# Altium footprint library PcbLib.PcbLib: 428 footprints (part 24 of 27)
Each footprint in its own frame and in the unit in brackets; x right, y up, seen from the top. Pads: shape width x height; smd on the part's side, far side on the other; paste and mask are expansions set on the pad; w line width, h text height; cw(c..) or ccw(c..) is an arc to the next point about the centre after c.
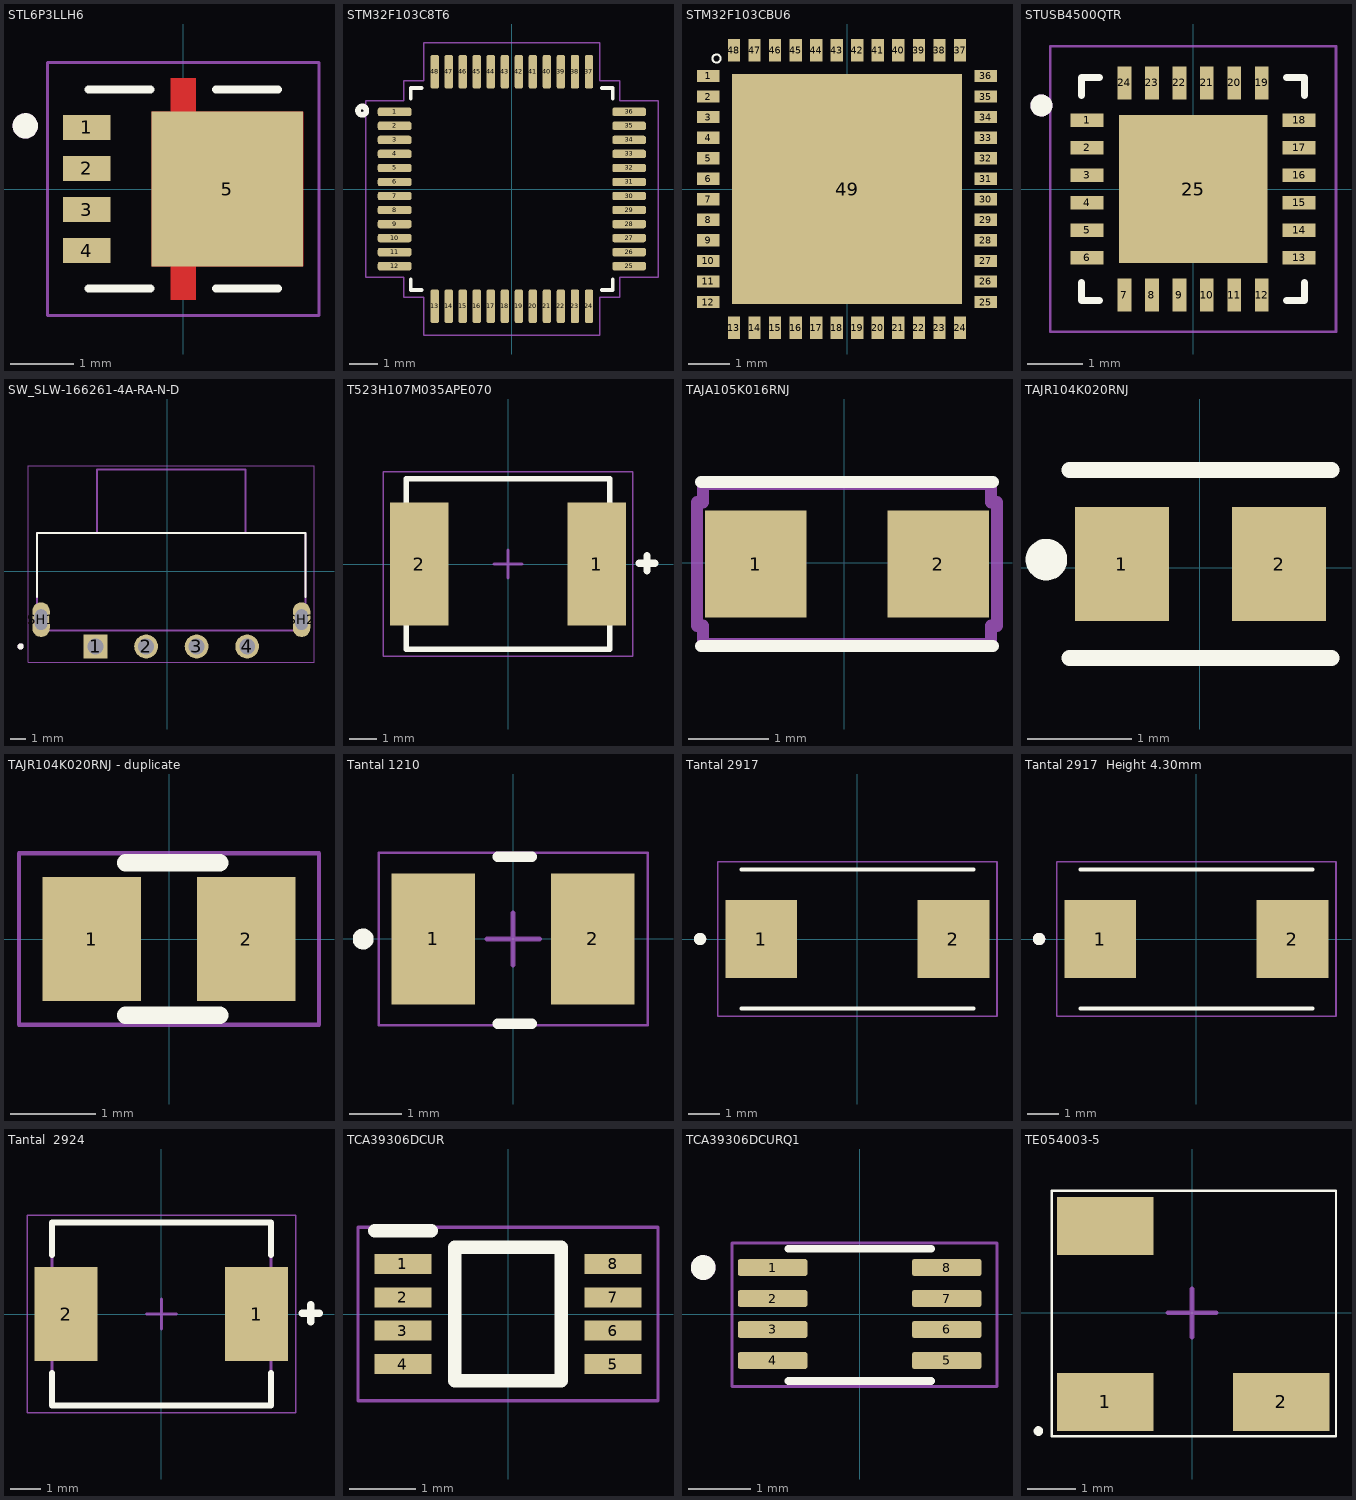
[diagram p23: the footprints below, top view; thin cyan lines are the x and y axes]

## STL6P3LLH6 [mm]
pads (5):
  rect 0.75x0.4 smd: 1(-1.525,0.975) 2(-1.525,0.325) 3(-1.525,-0.325) 4(-1.525,-0.975)
  rect 2.4x2.45 smd paste-0.44 mask+0.1: 5(0.7,0)
Top Layer:
  region: 0.2,1.225 1.9,1.225 1.9,-1.225 0.2,-1.225 0.2,-1.755 -0.2,-1.755 -0.2,-1.225 -0.5,-1.225 -0.5,1.225 -0.2,1.225 -0.2,1.755 0.2,1.755
Top Overlay:
  circle w0.2: c-2.5,1 r0.1
  lines w0.127: -1.5,-1.575 -0.52,-1.575 ; -1.5,1.575 -0.52,1.575 ; 0.52,-1.575 1.5,-1.575 ; 0.52,1.575 1.5,1.575
Top Paste:
  region: 0.2,1.23 -0.2,1.23 -0.2,1.755 0.2,1.755
  region: 0.2,-1.755 -0.2,-1.755 -0.2,-1.23 0.2,-1.23
Top Solder:
  rectangle: -0.291,-1.824 0.283,-1.3
  rectangle: -0.286,1.316 0.288,1.841
Mechanical 13:
  circle w0.2: c-2.5,1 r0.1
Mechanical 15:
  lines w0.05: -2.15,-2.005 2.15,-2.005 2.15,2.005 -2.15,2.005 -2.15,-2.005
3D body "step_temp.STEP": height 0.9, standoff 0, extent -1.65,-1.65 1.65,1.65

## STM32F103C8T6 [mm]
pads (48):
  rrect50% 1.2x0.3 smd: 1(-4.18,2.75) 2(-4.18,2.25) 3(-4.18,1.75) 4(-4.18,1.25) 5(-4.18,0.75) 6(-4.18,0.25) 7(-4.18,-0.25) 8(-4.18,-0.75) 9(-4.18,-1.25) 10(-4.18,-1.75) 11(-4.18,-2.25) 12(-4.18,-2.75) 25(4.18,-2.75) 26(4.18,-2.25) 27(4.18,-1.75) 28(4.18,-1.25) 29(4.18,-0.75) 30(4.18,-0.25) 31(4.18,0.25) 32(4.18,0.75) 33(4.18,1.25) 34(4.18,1.75) 35(4.18,2.25) 36(4.18,2.75)
  rrect50% 0.3x1.2 smd: 13(-2.75,-4.18) 14(-2.25,-4.18) 15(-1.75,-4.18) 16(-1.25,-4.18) 17(-0.75,-4.18) 18(-0.25,-4.18) 19(0.25,-4.18) 20(0.75,-4.18) 21(1.25,-4.18) 22(1.75,-4.18) 23(2.25,-4.18) 24(2.75,-4.18) 37(2.75,4.18) 38(2.25,4.18) 39(1.75,4.18) 40(1.25,4.18) 41(0.75,4.18) 42(0.25,4.18) 43(-0.25,4.18) 44(-0.75,4.18) 45(-1.25,4.18) 46(-1.75,4.18) 47(-2.25,4.18) 48(-2.75,4.18)
Top Overlay:
  circle w0.2: c-5.334,2.794 r0.15
  lines w0.127: -3.6,-3.21 -3.6,-3.6 -3.21,-3.6 ; -3.6,3.21 -3.6,3.6 -3.21,3.6 ; 3.21,-3.6 3.6,-3.6 3.6,-3.21 ; 3.21,3.6 3.6,3.6 3.6,3.21
Mechanical 15:
  lines w0.05: -5.21,-3.14 -5.21,3.14 -3.85,3.14 -3.85,3.85 -3.14,3.85 -3.14,5.21 3.14,5.21 3.14,3.85 3.85,3.85 3.85,3.14 5.21,3.14 5.21,-3.14 3.85,-3.14 3.85,-3.85 3.14,-3.85 3.14,-5.21 -3.14,-5.21 -3.14,-3.85 -3.85,-3.85 -3.85,-3.14 -5.21,-3.14
3D body "step_temp.STEP": height 1.6, standoff 0, extent -4.5,-4.5 4.5,4.5

## STM32F103CBU6 [mm]
pads (49):
  rect 0.55x0.3 smd: 1(-3.375,2.75) 2(-3.375,2.25) 3(-3.375,1.75) 4(-3.375,1.25) 5(-3.375,0.75) 6(-3.375,0.25) 7(-3.375,-0.25) 8(-3.375,-0.75) 9(-3.375,-1.25) 10(-3.375,-1.75) 11(-3.375,-2.25) 12(-3.375,-2.75) 25(3.375,-2.75) 26(3.375,-2.25) 27(3.375,-1.75) 28(3.375,-1.25) 29(3.375,-0.75) 30(3.375,-0.25) 31(3.375,0.25) 32(3.375,0.75) 33(3.375,1.25) 34(3.375,1.75) 35(3.375,2.25) 36(3.375,2.75)
  rect 0.3x0.55 smd: 13(-2.75,-3.375) 14(-2.25,-3.375) 15(-1.75,-3.375) 16(-1.25,-3.375) 17(-0.75,-3.375) 18(-0.25,-3.375) 19(0.25,-3.375) 20(0.75,-3.375) 21(1.25,-3.375) 22(1.75,-3.375) 23(2.25,-3.375) 24(2.75,-3.375) 37(2.75,3.375) 38(2.25,3.375) 39(1.75,3.375) 40(1.25,3.375) 41(0.75,3.375) 42(0.25,3.375) 43(-0.25,3.375) 44(-0.75,3.375) 45(-1.25,3.375) 46(-1.75,3.375) 47(-2.25,3.375) 48(-2.75,3.375)
  rect 5.6x5.6 smd paste-0.7: 49(0,0)
Top Overlay:
  circle w0.05: c-3.175,3.175 r0.1
3D body "step_temp.STEP": height 0.6, standoff 0, extent -3.5,-3.5 3.5,3.5

## STUSB4500QTR [mm]
pads (25):
  rect 0.6x0.25 smd: 1(-1.93,1.25) 2(-1.93,0.75) 3(-1.93,0.25) 4(-1.93,-0.25) 5(-1.93,-0.75) 6(-1.93,-1.25) 13(1.93,-1.25) 14(1.93,-0.75) 15(1.93,-0.25) 16(1.93,0.25) 17(1.93,0.75) 18(1.93,1.25)
  rect 0.25x0.6 smd: 7(-1.25,-1.93) 8(-0.75,-1.93) 9(-0.25,-1.93) 10(0.25,-1.93) 11(0.75,-1.93) 12(1.25,-1.93) 19(1.25,1.93) 20(0.75,1.93) 21(0.25,1.93) 22(-0.25,1.93) 23(-0.75,1.93) 24(-1.25,1.93)
  rect 2.7x2.7 smd paste-2: 25(0,0)
Top Overlay:
  circle w0.2: c-2.76,1.52 r0.1
  lines w0.127: -2.03,-1.7 -2.03,-2.03 -1.7,-2.03 ; -2.03,1.7 -2.03,2.03 -1.7,2.03 ; 1.7,-2.03 2.03,-2.03 2.03,-1.7 ; 1.7,2.03 2.03,2.03 2.03,1.7
Top Paste:
  region: 1.09,0.13 0.13,0.13 0.13,1.09 1.09,1.09
  region: -0.13,0.13 -1.09,0.13 -1.09,1.09 -0.13,1.09
  region: -0.13,-1.09 -1.09,-1.09 -1.09,-0.13 -0.13,-0.13
  region: 1.09,-1.09 0.13,-1.09 0.13,-0.13 1.09,-0.13
Mechanical 13:
  circle w0.2: c-2.76,1.52 r0.1
Mechanical 15:
  lines w0.05: -2.6,-2.6 2.6,-2.6 2.6,2.6 -2.6,2.6 -2.6,-2.6
3D body "step_temp.STEP": height 1, standoff 0, extent -2,-2 2,2

## SW_SLW-166261-4A-RA-N-D [mm]
pads (6):
  rect 1.508x1.508 / inner round 1.508 / far side rect 1.508x1.508 hole 1 mask+0.102: 1(-4.546,-4.75)
  round 1.508 hole 1 mask+0.102: 2(-1.346,-4.75) 3(1.854,-4.75) 4(5.054,-4.75)
  oval 1.1x2.2 hole 0.8 slot 1.3 at 90 deg mask+0.102: SH1(-7.996,-3.05) SH2(8.504,-3.05)
Top Overlay:
  circle w0.2: c-9.296,-4.75 r0.1
  lines w0.127: -8.246,-1.63 -8.246,2.45 8.754,2.45 8.754,-1.63
Mechanical 13:
  circle w0.2: c-9.296,-4.75 r0.1
  lines w0.127: -4.446,2.45 4.954,2.45 ; -4.446,2.45 -8.246,2.45 -8.246,-3.75 8.754,-3.75 8.754,2.45 4.954,2.45 ; -4.446,2.45 -4.446,6.45 4.954,6.45 4.954,2.45
Mechanical 15:
  lines w0.05: -8.796,-5.754 -8.796,6.7 9.304,6.7 9.304,-5.754 -8.796,-5.754
3D body "step_temp.STEP": height 6.16, standoff -4.39, extent -8.246,-4.947 8.754,6.553

## T523H107M035APE070 [mm] "Molded Capacitor, 2-Leads, Body 7.30x6.10mm, IPC Medium Density"
height 4.1
pads (2):
  rect 2.1x4.4 smd: 1(3.175,0) 2(-3.175,0)
Top Overlay:
  lines w0.2: -3.65,-1.975 -3.65,-3.05 3.65,-3.05 3.65,-1.975 ; -3.65,1.975 -3.65,3.05 3.65,3.05 3.65,1.975
  lines w0.254: 4.699,0.025 5.258,0.025 ; 4.978,-0.254 4.978,0.305
Mechanical 15:
  lines w0.05: -4.475,-3.3 -4.475,3.3 4.475,3.3 4.475,-3.3 -4.475,-3.3
  lines w0.1: -0.5,0 0.5,0 ; 0,-0.5 0,0.5
3D body "T523H107M035APE070--3DModel-STEP-56544.STEP": height 2, standoff 0, extent -3.65,-3 3.65,3

## TAJA105K016RNJ [mm]
pads (2):
  rect 1.27x1.346 smd paste+0 mask+0: 1(-1.106,-0.015) 2(1.18,-0.015)
Top Overlay:
  lines w0.152: -1.792,-1.044 1.866,-1.044 ; -1.792,1.014 1.866,1.014
Mechanical 15:
  lines w0.152: -1.843,-0.79 -1.843,0.76 -1.766,0.76 -1.766,0.988 1.84,0.988 1.84,0.76 1.917,0.76 1.917,-0.79 1.84,-0.79 1.84,-1.018 -1.766,-1.018 -1.766,-0.79 -1.843,-0.79
3D body "TAJA_AVX.step": height 1.85, standoff 0, extent -1.636,-0.924 1.768,0.88

## TAJR104K020RNJ [mil]
pads (2):
  rect 35.5x43 smd paste+0 mask+0: 1(-29.48,1.34) 2(30.03,1.34)
Top Overlay:
  circle w7.87: c-58,3 r3.94
  lines w6: -49.22,-34.16 49.78,-34.16 ; -49.22,36.84 49.78,36.84
3D body "TAJR_AVX.step": height 49.02, standoff 0, extent -44.21,-29.17 44.76,31.85

## TAJR104K020RNJ - duplicate [mm]
pads (2):
  rect 1.15x1.45 smd: 1(-0.9,0) 2(0.9,0)
Top Overlay:
  lines w0.2: -0.508,-0.889 0.592,-0.889 ; -0.508,0.889 0.592,0.889
Mechanical 15:
  lines w0.05: -1.75,-1 -1.75,1 1.75,1 1.75,-1 -1.75,-1
3D body "step_temp.STEP": height 1.2, standoff 0, extent -1.025,-0.65 1.025,0.65

## Tantal 1210 [mm] "Molded Capacitor, 2-Leads, Body 3.50x2.80mm, IPC Medium Density"
height 2.1
pads (2):
  rect 1.6x2.5 smd: 1(-1.525,0) 2(1.525,0)
Top Overlay:
  circle w0.2: c-2.87,0 r0.1
  lines w0.2: -0.294,-1.626 0.356,-1.626 ; -0.294,1.575 0.356,1.575
Mechanical 15:
  lines w0.05: -2.575,-1.65 -2.575,1.65 2.575,1.65 2.575,-1.65 -2.575,-1.65
  lines w0.1: -0.5,0 0.5,0 ; 0,-0.5 0,0.5
3D body "TLJB_AVX.step": height 2.16, standoff 0, extent -1.803,-1.499 1.905,1.499

## Tantal 2917 [mm]
pads (2):
  rect 2.31x2.52 smd: 1(-3.1,0) 2(3.1,0)
Top Overlay:
  circle w0.2: c-5.08,0 r0.1
  lines w0.127: -3.75,-2.25 3.75,-2.25 ; -3.75,2.25 3.75,2.25
Mechanical 15:
  lines w0.05: -4.505,-2.5 -4.505,2.5 4.505,2.5 4.505,-2.5 -4.505,-2.5
3D body "User Library-AVX_E_CASE.STEP": height 4.2, standoff 0, extent -3.649,-2.225 3.751,2.225

## Tantal 2917  Height 4.30mm [mm]
pads (2):
  rect 2.31x2.52 smd: 1(-3.1,0) 2(3.1,0)
Top Overlay:
  circle w0.2: c-5.08,0 r0.1
  lines w0.127: -3.75,-2.25 3.75,-2.25 ; -3.75,2.25 3.75,2.25
Mechanical 13:
  circle w0.2: c-5.08,0 r0.1
Mechanical 15:
  lines w0.05: -4.505,-2.5 4.505,-2.5 4.505,2.5 -4.505,2.5 -4.505,-2.5
3D body "User Library-AVX_E_CASE.STEP": height 4.2, standoff 0, extent -3.649,-2.225 3.751,2.225

## Tantal  2924 [mm] "Molded Capacitor, 2-Leads, Body 7.30x6.10mm, IPC Medium Density"
height 4.1
pads (2):
  rect 2.1x3.15 smd: 1(3.175,0) 2(-3.175,0)
Top Overlay:
  lines w0.2: -3.65,-1.975 -3.65,-3.05 3.65,-3.05 3.65,-1.975 ; -3.65,1.975 -3.65,3.05 3.65,3.05 3.65,1.975
  lines w0.254: 4.699,0.025 5.258,0.025 ; 4.978,-0.254 4.978,0.305
Mechanical 13:
  lines w0.1: -3.65,-3.05 -3.65,3.05 3.65,3.05 3.65,-3.05 -3.65,-3.05
Mechanical 15:
  lines w0.05: -4.475,-3.3 -4.475,3.3 4.475,3.3 4.475,-3.3 -4.475,-3.3
  lines w0.1: -0.5,0 0.5,0 ; 0,-0.5 0,0.5
3D body "User Library-CT_V.STEP": height 3.45, standoff 0, extent -3.65,-2.999 3.65,3.101

## TCA39306DCUR [mm]
pads (8):
  rect 0.85x0.3 smd: 1(-1.575,0.75) 2(-1.575,0.25) 3(-1.575,-0.25) 4(-1.575,-0.75) 5(1.575,-0.75) 6(1.575,-0.25) 7(1.575,0.25) 8(1.575,0.75)
Top Overlay:
  lines w0.2: -2,1.25 -1.15,1.25 ; -0.8,-1 0.8,-1 0.8,1 -0.8,1 -0.8,-1
Mechanical 15:
  lines w0.05: -2.25,-1.3 2.25,-1.3 2.25,1.3 -2.25,1.3 -2.25,-1.3
3D body "TCA39306DCUR.stp": height 0.77, standoff 0, extent -1.55,-1 1.55,1

## TCA39306DCURQ1 [mm]
pads (8):
  rrect25% 1.12x0.27 smd: 1(-1.405,0.75) 2(-1.405,0.25) 3(-1.405,-0.25) 4(-1.405,-0.75) 5(1.405,-0.75) 6(1.405,-0.25) 7(1.405,0.25) 8(1.405,0.75)
Top Overlay:
  circle w0.2: c-2.525,0.75 r0.1
  lines w0.127: -1.15,-1.078 1.15,-1.078 ; -1.15,1.053 1.15,1.053
Mechanical 13:
  circle w0.2: c-2.525,0.75 r0.1
Mechanical 15:
  lines w0.05: -2.057,-1.168 -2.057,1.143 2.215,1.143 2.215,-1.168 -2.057,-1.168
3D body "step_temp.STEP": height 0.9, standoff 0, extent -1.55,-1 1.55,1

## TE054003-5 [mm] "DFN, 4-Leads, Body 5.50x5.50mm, Pitch 3.70mm, IPC Medium Density"
height 2
pads (3):
  rect 2x1.2 smd: 1(-1.8,-1.85) 2(1.849,-1.85) ""(-1.8,1.799)
Top Overlay:
  circle w0.1: c-3.19,-2.455 r0.05
  lines w0.05: -2.911,-2.561 2.986,-2.561 2.986,2.537 -2.911,2.537 -2.911,-2.561
Mechanical 15:
  lines w0.1: -0.5,0 0.5,0 ; 0,-0.5 0,0.5
3D body "Part1.STEP": height 2.3, standoff 0, extent -2.731,-2.585 2.782,2.407